# Altium footprint library ZJUDancer_Circuit_V4.1.PcbLib: 96 footprints (part 5 of 6)
Each footprint in its own frame and in the unit in brackets; x right, y up, seen from the top. Pads: shape width x height; smd on the part's side, far side on the other; paste and mask are expansions set on the pad; w line width, h text height; cw(c..) or ccw(c..) is an arc to the next point about the centre after c.
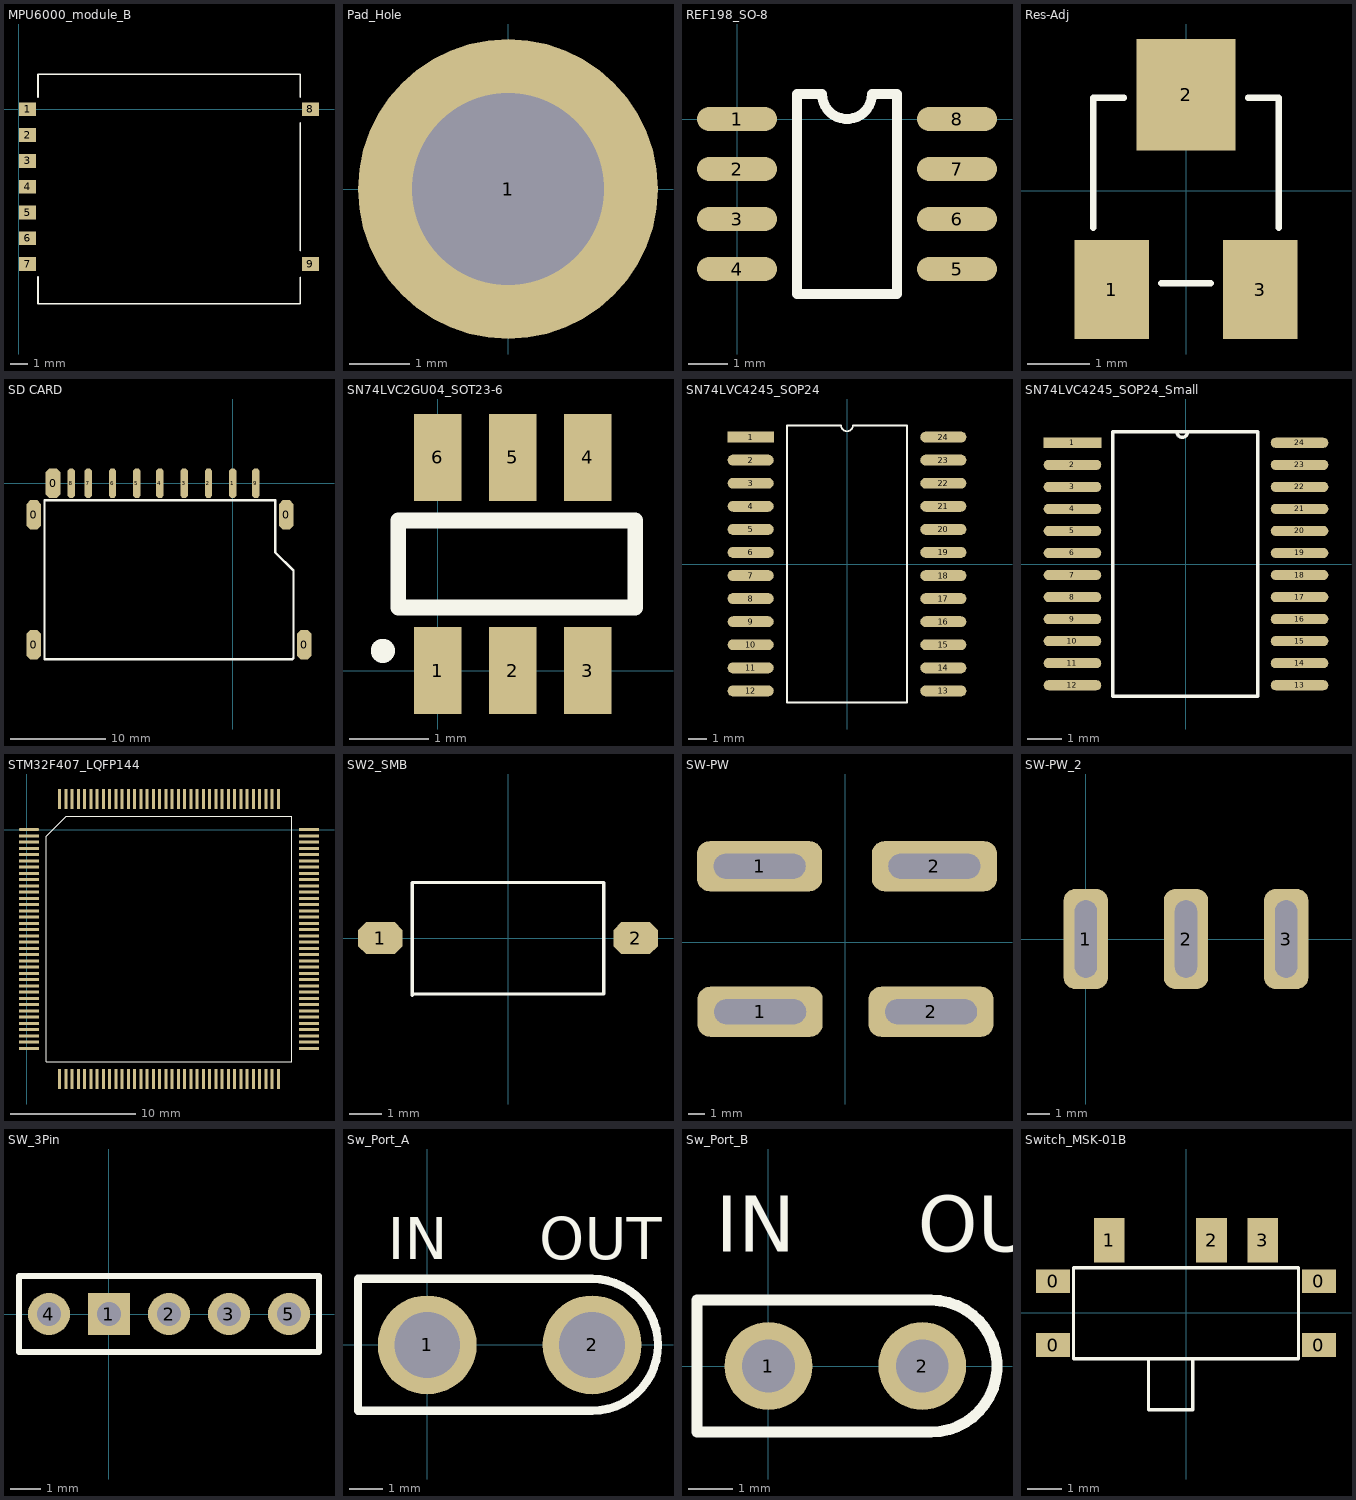
[diagram p4: the footprints below, top view; thin cyan lines are the x and y axes]

## MPU6000_module_B [mm]
pads (9):
  rect 1x0.8 smd: 1(0.5,0) 2(0.5,-1.5) 3(0.5,-3) 4(0.5,-4.5) 5(0.5,-6) 6(0.5,-7.5) 7(0.5,-9) 8(16.942,0) 9(16.942,-9)
Top Overlay:
  lines w0.1: 1.102,-9.727 1.102,-11.3 16.344,-11.3 16.344,-9.77 ; 1.102,0.722 1.102,2.035 16.344,2.035 16.344,0.721 ; 16.344,-8.223 16.344,-0.796
3D body: height 2.24, standoff 0.02, extent 1.102,-11.3 16.342,2.035

## Pad_Hole [mm]
pads (1):
  round 5 hole 3.2: 1(0,0)

## REF198_SO-8 [mil]
pads (8):
  oval 80x24 smd: 1(0,0) 2(0,-50) 3(0,-100) 4(0,-150) 5(220,-150) 6(220,-100) 7(220,-50) 8(220,0)
Top Overlay:
  lines w10: 60,-175 60,25 85,25 ccw(c110,25) 135,25 160,25 160,-175 60,-175
3D body: height 66.93, standoff 0, extent -5.9,-170.28 230.32,22.64

## Res-Adj [mm] "贴片可调电阻"
pads (3):
  rect 1.2x1.6 smd: 1(-1.2,-1.6) 3(1.2,-1.6)
  rect 1.6x1.8 smd: 2(0,1.55)
Top Overlay:
  lines w0.1: -1.5,-0.6 -1.5,1.5 -1,1.5 ; -0.4,-1.5 0.4,-1.5 ; 1,1.5 1.5,1.5 1.5,-0.6

## SD CARD [mil]
pads (14):
  oct 60x120 smd: 0(-820,-665) 0(-820,-130) 0(-740,0) 0(220,-130) 0(295,-665)
  oct 30x120 smd: 1(0,0) 2(-100,0) 3(-200,0) 4(-300,0) 5(-395,0) 6(-495,0) 7(-595,0) 8(-665,0) 9(95,0)
Top Overlay:
  lines w10: -775,-725 -775,-70 175,-70 175,-285 250,-360 250,-720 245,-725 -775,-725
3D body: height 118.57, standoff -38.91, extent -841.12,-1369.64 284.87,28

## SN74LVC2GU04_SOT23-6 [mm]
pads (6):
  rect 0.6x1.1 smd mask+0.07: 1(0,0) 2(0.95,0) 3(1.9,0) 4(1.9,2.7) 5(0.95,2.7) 6(0,2.7)
Top Overlay:
  circle w0.254: c-0.696,0.25 r0.025
  lines w0.2: -0.5,0.8 2.5,0.8 2.5,1.9 -0.5,1.9 -0.5,0.8
3D body: height 1.45, standoff -0.08, extent -0.5,-0.075 2.4,2.725

## SN74LVC4245_SOP24 [mm]
pads (24):
  rect 2.54x0.6 smd: 1(-5.3,6.985)
  oval 2.54x0.6 smd: 2(-5.3,5.715) 3(-5.3,4.445) 4(-5.3,3.175) 5(-5.3,1.905) 6(-5.3,0.635) 7(-5.3,-0.635) 8(-5.3,-1.905) 9(-5.3,-3.175) 10(-5.3,-4.445) 11(-5.3,-5.715) 12(-5.3,-6.985) 13(5.3,-6.985) 14(5.3,-5.715) 15(5.3,-4.445) 16(5.3,-3.175) 17(5.3,-1.905) 18(5.3,-0.635) 19(5.3,0.635) 20(5.3,1.905) 21(5.3,3.175) 22(5.3,4.445) 23(5.3,5.715) 24(5.3,6.985)
Top Overlay:
  lines w0.1: -3.295,-7.62 -3.295,7.62 -0.318,7.62 ccw(c0,7.62) 0.318,7.62 3.295,7.62 3.295,-7.62 -3.295,-7.62
3D body: height 1.65, standoff 0, extent -5.1,-7.69 5.2,7.71

## SN74LVC4245_SOP24_Small [mm]
pads (24):
  rect 1.7x0.3 smd: 1(-3.35,3.575)
  oval 1.7x0.3 smd: 2(-3.35,2.925) 3(-3.35,2.275) 4(-3.35,1.625) 5(-3.35,0.975) 6(-3.35,0.325) 7(-3.35,-0.325) 8(-3.35,-0.975) 9(-3.35,-1.625) 10(-3.35,-2.275) 11(-3.35,-2.925) 12(-3.35,-3.575) 13(3.35,-3.575) 14(3.35,-2.925) 15(3.35,-2.275) 16(3.35,-1.625) 17(3.35,-0.975) 18(3.35,-0.325) 19(3.35,0.325) 20(3.35,0.975) 21(3.35,1.625) 22(3.35,2.275) 23(3.35,2.925) 24(3.35,3.575)
Top Overlay:
  lines w0.1: -0.272,3.899 ccw(c-0.11,3.9) 0.053,3.9 ; -2.16,-3.9 -2.16,3.9 2.12,3.9 2.12,-3.9 -2.16,-3.9
3D body: height 0.95, standoff 0, extent -3.21,-3.905 3.19,3.895

## STM32F407_LQFP144 [mm]
height 1.5
pads (144):
  oval 1.6x0.254 smd: 1(0.2,0)
  rect 1.6x0.254 smd: 2(0.2,-0.5) 3(0.2,-1) 4(0.2,-1.5) 5(0.2,-2) 6(0.2,-2.5) 7(0.2,-3) 8(0.2,-3.5) 9(0.2,-4) 10(0.2,-4.5) 11(0.2,-5) 12(0.2,-5.5) 13(0.2,-6) 14(0.2,-6.5) 15(0.2,-7) 16(0.2,-7.5) 17(0.2,-8) 18(0.2,-8.5) 19(0.2,-9) 20(0.2,-9.5) 21(0.2,-10) 22(0.2,-10.5) 23(0.2,-11) 24(0.2,-11.5) 25(0.2,-12) 26(0.2,-12.5) 27(0.2,-13) 28(0.2,-13.5) 29(0.2,-14) 30(0.2,-14.5) 31(0.2,-15) 32(0.2,-15.5) 33(0.2,-16) 34(0.2,-16.5) 35(0.2,-17) 36(0.2,-17.5) 73(22.6,-17.5) 74(22.6,-17) 75(22.6,-16.5) 76(22.6,-16) 77(22.6,-15.5) 78(22.6,-15) 79(22.6,-14.5) 80(22.6,-14) 81(22.6,-13.5) 82(22.6,-13) 83(22.6,-12.5) 84(22.6,-12) 85(22.6,-11.5) 86(22.6,-11) 87(22.6,-10.5) 88(22.6,-10) 89(22.6,-9.5) 90(22.6,-9) 91(22.6,-8.5) 92(22.6,-8) 93(22.6,-7.5) 94(22.6,-7) 95(22.6,-6.5) 96(22.6,-6) 97(22.6,-5.5) 98(22.6,-5) 99(22.6,-4.5) 100(22.6,-4) 101(22.6,-3.5) 102(22.6,-3) 103(22.6,-2.5) 104(22.6,-2) 105(22.6,-1.5) 106(22.6,-1) 107(22.6,-0.5) 108(22.6,0)
  rect 0.254x1.6 smd: 37(2.65,-19.95) 38(3.15,-19.95) 39(3.65,-19.95) 40(4.15,-19.95) 41(4.65,-19.95) 42(5.15,-19.95) 43(5.65,-19.95) 44(6.15,-19.95) 45(6.65,-19.95) 46(7.15,-19.95) 47(7.65,-19.95) 48(8.15,-19.95) 49(8.65,-19.95) 50(9.15,-19.95) 51(9.65,-19.95) 52(10.15,-19.95) 53(10.65,-19.95) 54(11.15,-19.95) 55(11.65,-19.95) 56(12.15,-19.95) 57(12.65,-19.95) 58(13.15,-19.95) 59(13.65,-19.95) 60(14.15,-19.95) 61(14.65,-19.95) 62(15.15,-19.95) 63(15.65,-19.95) 64(16.15,-19.95) 65(16.65,-19.95) 66(17.15,-19.95) 67(17.65,-19.95) 68(18.15,-19.95) 69(18.65,-19.95) 70(19.15,-19.95) 71(19.65,-19.95) 72(20.15,-19.95) 109(20.15,2.45) 110(19.65,2.45) 111(19.15,2.45) 112(18.65,2.45) 113(18.15,2.45) 114(17.65,2.45) 115(17.15,2.45) 116(16.65,2.45) 117(16.15,2.45) 118(15.65,2.45) 119(15.15,2.45) 120(14.65,2.45) 121(14.15,2.45) 122(13.65,2.45) 123(13.15,2.45) 124(12.65,2.45) 125(12.15,2.45) 126(11.65,2.45) 127(11.15,2.45) 128(10.65,2.45) 129(10.15,2.45) 130(9.65,2.45) 131(9.15,2.45) 132(8.65,2.45) 133(8.15,2.45) 134(7.65,2.45) 135(7.15,2.45) 136(6.65,2.45) 137(6.15,2.45) 138(5.65,2.45) 139(5.15,2.45) 140(4.65,2.45) 141(4.15,2.45) 142(3.65,2.45) 143(3.15,2.45) 144(2.65,2.45)
Top Overlay:
  lines w0.1: 1.585,-18.565 21.215,-18.565 21.215,1.065 3.17,1.065 1.585,-0.52 1.585,-18.565
3D body: height 1.5, standoff 0, extent 0.4,-19.75 22.4,2.25

## SW2_SMB [mm] "贴片按键开关"
pads (2):
  oct 1.4x1 smd: 1(-4,0) 2(4,0)
Top Overlay:
  lines w0.1: -3,-1.8 -3,1.75 3,1.75 3,-1.75 -3,-1.75
3D body: height 2.52, standoff 0.02, extent -3.949,-1.9 3.941,1.95

## SW-PW [mm]
pads (4):
  rrect50% 7.5x3 hole 1.5 slot 5.5 at 0 deg: 1(-5.14,4.55) 1(-5.11,-4.17) 2(5.13,-4.17) 2(5.33,4.55)
3D body: height 22.12, standoff -4.98, extent -10.71,-7.32 10.29,7.68

## SW-PW_2 [mm]
pads (3):
  rrect50% 2x4.5 hole 1 slot 3.5 at 90 deg: 1(0,0) 2(4.52,0) 3(9.04,0)
3D body: height 13.02, standoff -4.98, extent -3.135,-5.305 12.215,5.245

## SW_3Pin [mm] "三脚拨动开关"
pads (5):
  rect 1.4x1.4 hole 0.8: 1(0,0)
  round 1.4 hole 0.8: 2(2,0) 3(4,0) 4(-2,0) 5(6,0)
Top Overlay:
  lines w0.203: -3,-1.27 -3,1.27 7,1.27 7,-1.27 -3,-1.27

## Sw_Port_A [mm] "16V开关接口"
pads (2):
  round 3 hole 2: 1(0,0) 2(5,0)
Top Overlay:
  lines w0.254: -2.1,-2 -2.1,2 5,2 cw(c5,0) 5,-2 -2.1,-2
  text "OUT" at 3.4,2.6 h1.27
  text "IN" at -1.2,2.6 h1.27

## Sw_Port_B [mm] "上位机开关接口"
pads (2):
  round 2 hole 1.2: 1(0,0) 2(3.5,0)
Top Overlay:
  lines w0.254: -1.625,-1.5 3.7,-1.5 ccw(c3.7,0) 3.7,1.5 -1.625,1.5 -1.625,-1.5
  text "IN" at -1.2,2.6 h1.27
  text "OUT" at 3.4,2.6 h1.27

## Switch_MSK-01B [mm]
pads (7):
  rect 1x0.7 smd: 0(-3.9,-0.948) 0(-3.9,0.923) 0(3.9,-0.948) 0(3.9,0.923)
  rect 0.9x1.3 smd: 1(-2.25,2.127) 2(0.75,2.127) 3(2.25,2.127)
Top Overlay:
  lines w0.1: -1.1,-1.35 -1.1,-2.85 0.2,-2.85 0.2,-1.35 ; -3.3,-1.35 -3.3,1.325 3.3,1.325 3.3,-1.35 -3.3,-1.35
3D body: height 1.42, standoff -0.48, extent -3.9,-2.85 3.9,2.35